# Altium footprint library IC_SMD_QUAD.PCBLIB: 124 footprints (part 5 of 8)
Each footprint in its own frame and in the unit in brackets; x right, y up, seen from the top. Pads: shape width x height; smd on the part's side, far side on the other; paste and mask are expansions set on the pad; w line width, h text height; cw(c..) or ccw(c..) is an arc to the next point about the centre after c.
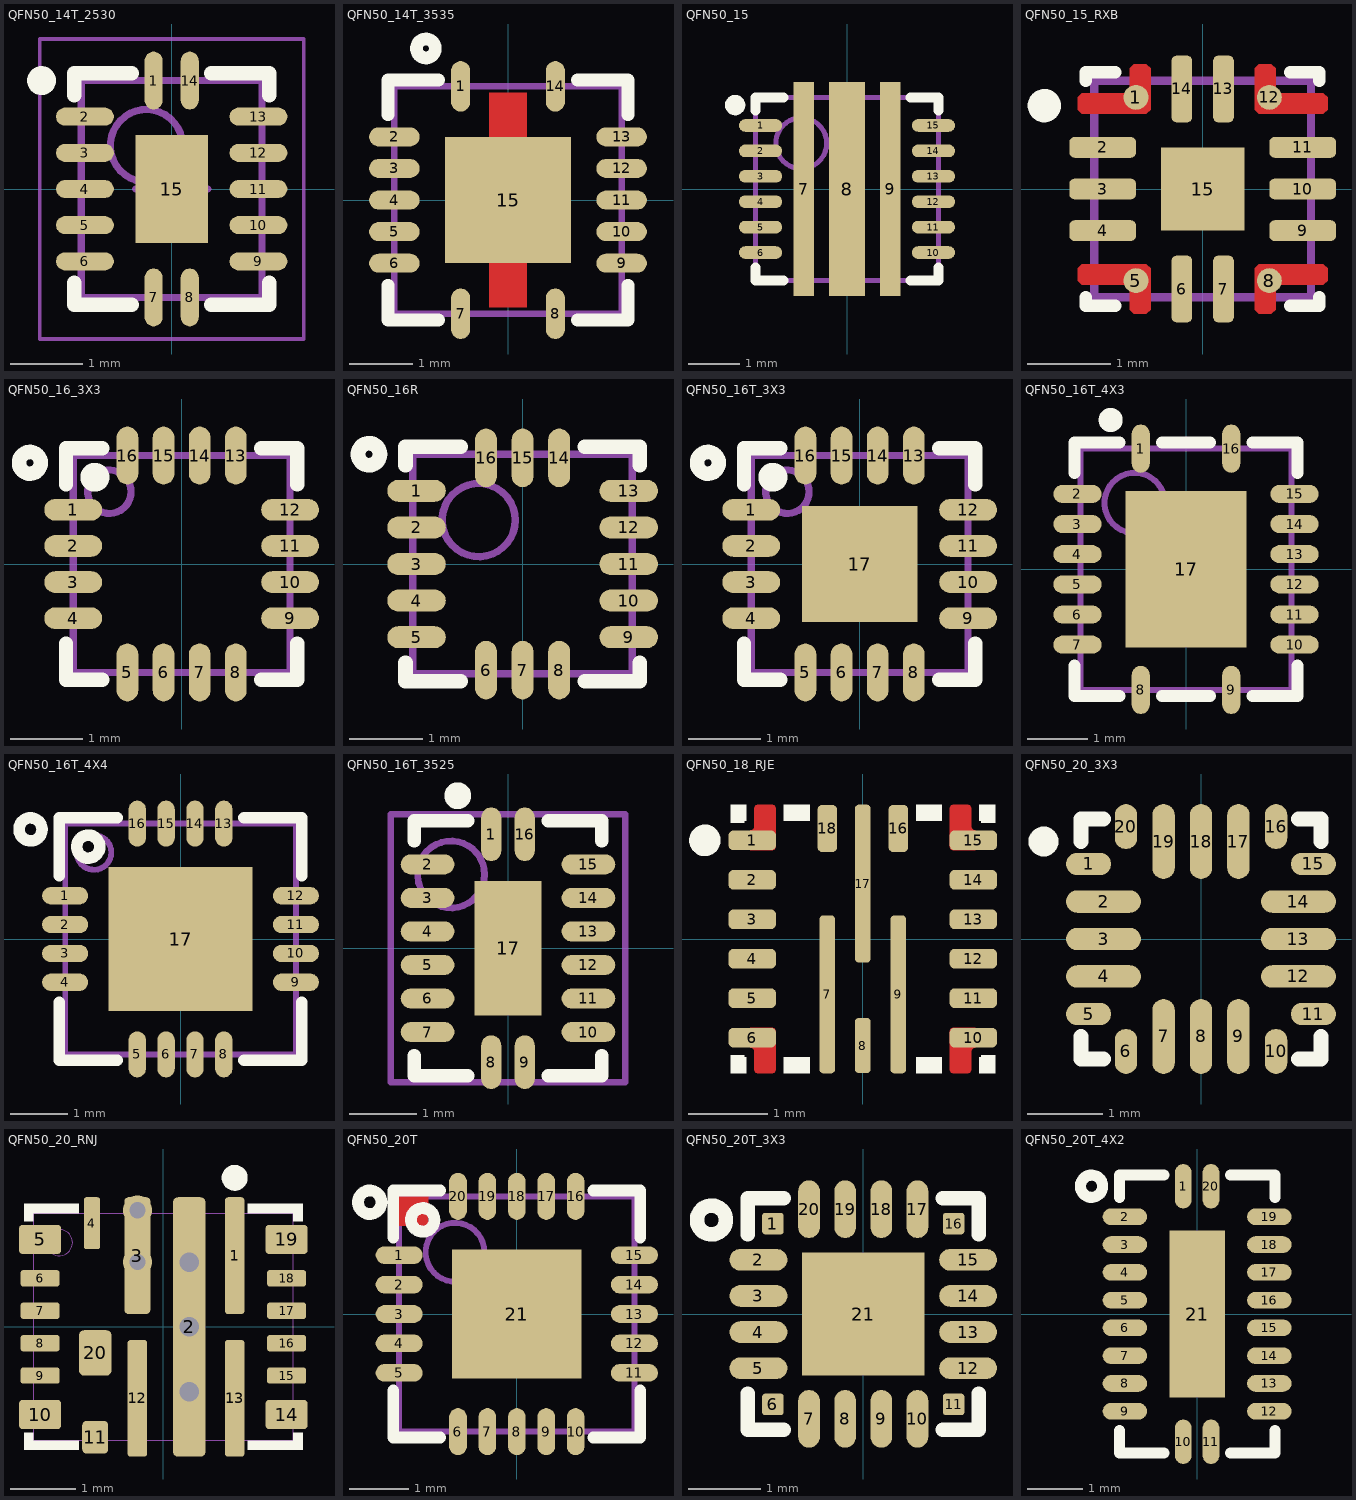
[diagram p4: the footprints below, top view; thin cyan lines are the x and y axes]

## QFN50_14T_2530 [mm] "DHVQFN14, 0.5mm pitch, 2.5x3x0.85mm"
height 1
pads (15):
  oval 0.25x0.8 smd mask+0.075: 1(-0.25,1.5) 7(-0.25,-1.5) 8(0.25,-1.5) 14(0.25,1.5)
  oval 0.8x0.25 smd mask+0.075: 2(-1.2,1) 3(-1.2,0.5) 4(-1.2,0) 5(-1.2,-0.5) 6(-1.2,-1) 9(1.2,-1) 10(1.2,-0.5) 11(1.2,0) 12(1.2,0.5) 13(1.2,1)
  rect 1x1.5 smd paste-3: 15(0,0)
TopOverlay:
  circle w0.2: c-1.8,1.5 r0.1
  lines w0.2: -1.35,-1.3 -1.35,-1.6 -0.55,-1.6 ; -1.35,1.3 -1.35,1.6 -0.55,1.6 ; 0.55,-1.6 1.35,-1.6 1.35,-1.3 ; 0.55,1.6 1.35,1.6 1.35,1.3
TopPaste:
  region: 0.4,-0.4 0.4,0.4 -0.4,0.4 -0.4,-0.4
Mechanical13:
  circle w0.1: c-0.35,0.6 r0.5
  lines w0.1: -1.25,-1.5 -1.25,1.5 1.25,1.5 1.25,-1.5 -1.25,-1.5
Mechanical15:
  lines w0.05: -1.825,-2.075 -1.825,2.075 1.825,2.075 1.825,-2.075 -1.825,-2.075
  lines w0.1: -0.5,0 0.5,0 ; 0,-0.5 0,0.5
3D body "QFN50_14T_2531.step": height 1, standoff 0, extent -1.251,-1.501 1.251,1.501

## QFN50_14T_3535 [mm] "S-PVQFN-N14, 3.5X3.5mm, pitch: 0.5mm, 6+2+6+2"
pads (15):
  oval 0.3x0.8 smd mask+0.075: 1(-0.75,1.8) 7(-0.75,-1.8) 8(0.75,-1.8) 14(0.75,1.8)
  oval 0.8x0.3 smd mask+0.075: 2(-1.8,1) 3(-1.8,0.5) 4(-1.8,0) 5(-1.8,-0.5) 6(-1.8,-1) 9(1.8,-1) 10(1.8,-0.5) 11(1.8,0) 12(1.8,0.5) 13(1.8,1)
  rect 2x2 smd paste-2 mask+0.1: 15(0,0)
TopLayer:
  rectangle: -0.3,-1.7 0.3,1.7
TopOverlay:
  circle w0.2: c-1.3,2.4 r0.15
  lines w0.2: -1.9,-1.35 -1.9,-1.9 -1.1,-1.9 ; -1.9,1.35 -1.9,1.9 -1.1,1.9 ; 1.1,-1.9 1.9,-1.9 1.9,-1.35 ; 1.1,1.9 1.9,1.9 1.9,1.35
TopPaste:
  rectangle: -0.9,0.1 -0.1,0.9
  region: 0.9,0.9 0.1,0.9 0.1,0.1 0.9,0.1
  region: 0.9,-0.1 0.1,-0.1 0.1,-0.9 0.9,-0.9
  rectangle: -0.9,-0.9 -0.1,-0.1
TopSolder:
  rectangle: -0.4,-1.8 0.4,1.8
Mechanical13:
  lines w0.1: -1.8,-1.8 1.8,-1.8 1.8,1.8 -1.8,1.8 -1.8,-1.8
3D body: height 1, standoff 0, extent -1.8,-1.8 1.8,1.8

## QFN50_15 [mm] "PVQFN-N15"
pads (15):
  oval 0.85x0.25 smd mask+0.075: 1(-1.7,1.25) 2(-1.7,0.75) 3(-1.7,0.25) 4(-1.7,-0.25) 5(-1.7,-0.75) 6(-1.7,-1.25) 10(1.7,-1.25) 11(1.7,-0.75) 12(1.7,-0.25) 13(1.7,0.25) 14(1.7,0.75) 15(1.7,1.25)
  rect 0.4x4.2 smd paste-1.8 mask+0.075: 7(-0.85,0) 9(0.85,0)
  rect 0.7x4.2 smd paste-1.8 mask+0.075: 8(0,0)
TopOverlay:
  circle w0.2: c-2.2,1.65 r0.1
  lines w0.2: -1.8,-1.55 -1.8,-1.8 -1.25,-1.8 ; -1.8,1.55 -1.8,1.8 -1.25,1.8 ; 1.25,-1.8 1.8,-1.8 1.8,-1.55 ; 1.25,1.8 1.8,1.8 1.8,1.55
TopPaste:
  rectangle: -1.05,1.3 -0.65,2.1
  rectangle: -1.05,-2.1 -0.65,-1.3
  rectangle: -1.05,0.2 -0.65,1
  rectangle: -1.05,-1 -0.65,-0.2
  region: 1.05,-0.2 0.65,-0.2 0.65,-1 1.05,-1
  region: 1.05,1 0.65,1 0.65,0.2 1.05,0.2
  region: 1.05,-1.3 0.65,-1.3 0.65,-2.1 1.05,-2.1
  region: 1.05,2.1 0.65,2.1 0.65,1.3 1.05,1.3
  rectangle: -0.3,-1 0.3,-0.2
  rectangle: -0.3,0.2 0.3,1
  rectangle: -0.3,-2.1 0.3,-1.3
  rectangle: -0.3,1.3 0.3,2.1
Mechanical13:
  circle w0.1: c-0.9,0.9 r0.5
  lines w0.1: -1.8,-1.8 -1.8,1.8 1.8,1.8 1.8,-1.8 -1.8,-1.8
3D body "QFN50_155.step": height 1.03, standoff 0.02, extent -1.801,-1.8 1.801,1.8

## QFN50_15_RXB [mm] "VQFN-FCRLF RXB, 2.6X2.6X1mm"
height 1
pads (15):
  round 0.3 smd paste-1 mask+0: 1(-0.8,1.1) 5(-0.8,-1.1) 8(0.8,-1.1) 12(0.8,1.1)
  rrect50% 0.8x0.25 smd paste+0 mask+0.05: 2(-1.2,0.5) 3(-1.2,0) 4(-1.2,-0.5) 9(1.2,-0.5) 10(1.2,0) 11(1.2,0.5)
  rrect50% 0.25x0.8 smd paste+0 mask+0.05: 6(-0.25,-1.2) 7(0.25,-1.2) 13(0.25,1.2) 14(-0.25,1.2)
  rect 1x1 smd paste-0.1 mask+0.05: 15(0,0)
TopLayer:
  region: 1.45,-0.9 1.5,-0.95 1.5,-1.1 1.45,-1.15 0.925,-1.15 0.875,-1.2 0.875,-1.45 0.825,-1.5 0.675,-1.5 0.625,-1.45 0.625,-0.95 0.675,-0.9
  region: -1.45,-0.9 -1.5,-0.95 -1.5,-1.1 -1.45,-1.15 -0.925,-1.15 -0.875,-1.2 -0.875,-1.45 -0.825,-1.5 -0.675,-1.5 -0.625,-1.45 -0.625,-0.95 -0.675,-0.9
  region: 1.45,0.9 1.5,0.95 1.5,1.1 1.45,1.15 0.925,1.15 0.875,1.2 0.875,1.45 0.825,1.5 0.675,1.5 0.625,1.45 0.625,0.95 0.675,0.9
  region: -1.45,0.9 -1.5,0.95 -1.5,1.1 -1.45,1.15 -0.925,1.15 -0.875,1.2 -0.875,1.45 -0.825,1.5 -0.675,1.5 -0.625,1.45 -0.625,0.95 -0.675,0.9
TopOverlay:
  circle w0.2: c-1.9,1 r0.1
  lines w0.15: -1.4,-1.3 -1.4,-1.4 -1.05,-1.4 ; -1.4,1.3 -1.4,1.4 -1.05,1.4 ; 1.05,-1.4 1.4,-1.4 1.4,-1.3 ; 1.05,1.4 1.4,1.4 1.4,1.3
TopSolder:
  region: 1.45,-0.9 1.5,-0.95 1.5,-1.1 1.45,-1.15 0.925,-1.15 0.875,-1.2 0.875,-1.45 0.825,-1.5 0.675,-1.5 0.625,-1.45 0.625,-0.95 0.675,-0.9
  region: -1.5,-1.1 -1.5,-0.95 -1.45,-0.9 -0.675,-0.9 -0.625,-0.95 -0.625,-1.45 -0.675,-1.5 -0.825,-1.5 -0.875,-1.45 -0.875,-1.2 -0.925,-1.15 -1.45,-1.15
  region: 1.5,1.1 1.5,0.95 1.45,0.9 0.675,0.9 0.625,0.95 0.625,1.45 0.675,1.5 0.825,1.5 0.875,1.45 0.875,1.2 0.925,1.15 1.45,1.15
  region: -1.45,0.9 -1.5,0.95 -1.5,1.1 -1.45,1.15 -0.925,1.15 -0.875,1.2 -0.875,1.45 -0.825,1.5 -0.675,1.5 -0.625,1.45 -0.625,0.95 -0.675,0.9
Mechanical13:
  lines w0.1: -1.3,-1.3 -1.3,1.3 1.3,1.3 1.3,-1.3 -1.3,-1.3

## QFN50_16_3X3 [mm] "LPCC, RGT, 16-lead, pitch: 0.5mm, 3x3mm"
height 1
pads (16):
  oval 0.8x0.3 smd mask+0.075: 1(-1.5,0.75) 2(-1.5,0.25) 3(-1.5,-0.25) 4(-1.5,-0.75) 9(1.5,-0.75) 10(1.5,-0.25) 11(1.5,0.25) 12(1.5,0.75)
  oval 0.3x0.8 smd mask+0.075: 5(-0.75,-1.5) 6(-0.25,-1.5) 7(0.25,-1.5) 8(0.75,-1.5) 13(0.75,1.5) 14(0.25,1.5) 15(-0.25,1.5) 16(-0.75,1.5)
TopOverlay:
  circle w0.2: c-2.1,1.4 r0.15
  circle w0.2: c-1.2,1.2 r0.1
  lines w0.2: -1.6,-1.1 -1.6,-1.6 -1.1,-1.6 ; -1.6,1.1 -1.6,1.6 -1.1,1.6 ; 1.1,-1.6 1.6,-1.6 1.6,-1.1 ; 1.1,1.6 1.6,1.6 1.6,1.1
Mechanical13:
  circle w0.1: c-1,1 r0.3
  lines w0.1: -1.5,-1.5 -1.5,1.5 1.5,1.5 1.5,-1.5 -1.5,-1.5
3D body: height 1, standoff 0, extent -1.5,-1.5 1.5,1.5

## QFN50_16R [mm] "TFLGA 3x3x1, 5+3+5+3, 3X3mm, 0.5mm pitch"
height 1
pads (16):
  oval 0.8x0.3 smd mask+0.075: 1(-1.45,1) 2(-1.45,0.5) 3(-1.45,0) 4(-1.45,-0.5) 5(-1.45,-1) 9(1.45,-1) 10(1.45,-0.5) 11(1.45,0) 12(1.45,0.5) 13(1.45,1)
  oval 0.3x0.8 smd mask+0.075: 6(-0.5,-1.45) 7(0,-1.45) 8(0.5,-1.45) 14(0.5,1.45) 15(0,1.45) 16(-0.5,1.45)
TopOverlay:
  circle w0.2: c-2.1,1.5 r0.15
  lines w0.2: -1.6,-1.35 -1.6,-1.6 -0.85,-1.6 ; -1.6,1.35 -1.6,1.6 -0.85,1.6 ; 0.85,-1.6 1.6,-1.6 1.6,-1.35 ; 0.85,1.6 1.6,1.6 1.6,1.35
Mechanical13:
  circle w0.1: c-0.6,0.6 r0.5
  lines w0.1: -1.5,-1.5 1.5,-1.5 1.5,1.5 -1.5,1.5 -1.5,-1.5
3D body: height 1, standoff 0, extent -1.5,-1.5 1.5,1.5

## QFN50_16T_3X3 [mm] "RGT PVQFN (TI), 16-lead, pitch: 0.5mm, 3x3mm"
height 1
pads (17):
  oval 0.8x0.3 smd mask+0.075: 1(-1.5,0.75) 2(-1.5,0.25) 3(-1.5,-0.25) 4(-1.5,-0.75) 9(1.5,-0.75) 10(1.5,-0.25) 11(1.5,0.25) 12(1.5,0.75)
  oval 0.3x0.8 smd mask+0.075: 5(-0.75,-1.5) 6(-0.25,-1.5) 7(0.25,-1.5) 8(0.75,-1.5) 13(0.75,1.5) 14(0.25,1.5) 15(-0.25,1.5) 16(-0.75,1.5)
  rect 1.6x1.6 smd paste-3 mask+0.1: 17(0,0)
TopOverlay:
  circle w0.2: c-2.1,1.4 r0.15
  circle w0.2: c-1.2,1.2 r0.1
  lines w0.2: -1.6,-1.1 -1.6,-1.6 -1.1,-1.6 ; -1.6,1.1 -1.6,1.6 -1.1,1.6 ; 1.1,-1.6 1.6,-1.6 1.6,-1.1 ; 1.1,1.6 1.6,1.6 1.6,1.1
TopPaste:
  rectangle: -0.7,-0.7 -0.1,-0.1
  region: 0.7,-0.1 0.1,-0.1 0.1,-0.7 0.7,-0.7
  region: 0.7,0.7 0.1,0.7 0.1,0.1 0.7,0.1
  rectangle: -0.7,0.1 -0.1,0.7
Mechanical13:
  circle w0.1: c-1,1 r0.3
  lines w0.1: -1.5,-1.5 -1.5,1.5 1.5,1.5 1.5,-1.5 -1.5,-1.5
3D body "RGT0016C.stp": height 1, standoff 0, extent -1.5,-1.5 1.5,1.5

## QFN50_16T_4X3 [mm] "VQFN-16 RGY 4X3.5mm, 0.5mm pitch"
height 1
pads (17):
  oval 0.3x0.8 smd mask+0.05: 1(-0.75,2) 8(-0.75,-2) 9(0.75,-2) 16(0.75,2)
  oval 0.8x0.3 smd mask+0.05: 2(-1.8,1.25) 3(-1.8,0.75) 4(-1.8,0.25) 5(-1.8,-0.25) 6(-1.8,-0.75) 7(-1.8,-1.25) 10(1.8,-1.25) 11(1.8,-0.75) 12(1.8,-0.25) 13(1.8,0.25) 14(1.8,0.75) 15(1.8,1.25)
  rect 2x2.6 smd paste-3: 17(0,0)
TopOverlay:
  circle w0.2: c-1.25,2.475 r0.1
  lines w0.2: -1.85,-1.6 -1.85,-2.1 -1.1,-2.1 ; -1.85,1.6 -1.85,2.1 -1.1,2.1 ; -0.4,-2.1 0.4,-2.1 ; -0.4,2.1 0.4,2.1 ; 1.1,-2.1 1.85,-2.1 1.85,-1.6 ; 1.1,2.1 1.85,2.1 1.85,1.6
TopPaste:
  rectangle: -0.9,0.2 -0.2,1.2
  region: 0.9,1.2 0.2,1.2 0.2,0.2 0.9,0.2
  region: 0.9,-0.2 0.2,-0.2 0.2,-1.2 0.9,-1.2
  rectangle: -0.9,-1.2 -0.2,-0.2
Mechanical13:
  circle w0.1: c-0.85,1.1 r0.5
  lines w0.1: -1.75,-2 1.75,-2 1.75,2 -1.75,2 -1.75,-2
3D body "QFN50_16T_400X350.step": height 1, standoff 0, extent -1.751,-2.001 1.751,2.001

## QFN50_16T_4X4 [mm] "QFN, 16, 4X4mm, 0.5mm"
height 1
pads (17):
  oval 0.8x0.3 smd mask+0.075: 1(-2,0.75) 2(-2,0.25) 3(-2,-0.25) 4(-2,-0.75) 9(2,-0.75) 10(2,-0.25) 11(2,0.25) 12(2,0.75)
  oval 0.3x0.8 smd mask+0.075: 5(-0.75,-2) 6(-0.25,-2) 7(0.25,-2) 8(0.75,-2) 13(0.75,2) 14(0.25,2) 15(-0.25,2) 16(-0.75,2)
  rect 2.5x2.5 smd paste-3 mask+0.1: 17(0,0)
TopOverlay:
  circle w0.2: c-1.6,1.6 r0.2
  circle w0.2: c-2.6,1.9 r0.2
  lines w0.2: -2.1,-1.1 -2.1,-2.1 -1.1,-2.1 ; -2.1,1.1 -2.1,2.1 -1.1,2.1 ; 1.1,-2.1 2.1,-2.1 2.1,-1.1 ; 1.1,2.1 2.1,2.1 2.1,1.1
TopPaste:
  rectangle: -1.1,-1.1 -0.2,-0.2
  region: 1.1,-0.2 0.2,-0.2 0.2,-1.1 1.1,-1.1
  region: 1.1,1.1 0.2,1.1 0.2,0.2 1.1,0.2
  rectangle: -1.1,0.2 -0.2,1.1
Mechanical13:
  circle w0.1: c-1.5,1.5 r0.3
  lines w0.1: -2,-2 -2,2 2,2 2,-2 -2,-2
3D body: height 1, standoff 0, extent -2,-2 2,2

## QFN50_16T_3525 [mm] "VQFN-16 RGY 3.5X2.5mm, 0.5mm pitch"
height 1
pads (17):
  oval 0.3x0.8 smd mask+0.05: 1(-0.25,1.7) 8(-0.25,-1.7) 9(0.25,-1.7) 16(0.25,1.7)
  oval 0.8x0.3 smd mask+0.05: 2(-1.2,1.25) 3(-1.2,0.75) 4(-1.2,0.25) 5(-1.2,-0.25) 6(-1.2,-0.75) 7(-1.2,-1.25) 10(1.2,-1.25) 11(1.2,-0.75) 12(1.2,-0.25) 13(1.2,0.25) 14(1.2,0.75) 15(1.2,1.25)
  rect 1x2 smd paste-0.1: 17(0,0)
TopOverlay:
  circle w0.2: c-0.75,2.275 r0.1
  lines w0.2: -1.4,-1.6 -1.4,-1.9 -0.6,-1.9 ; -1.4,1.6 -1.4,1.9 -0.6,1.9 ; 0.6,-1.9 1.4,-1.9 1.4,-1.6 ; 0.6,1.9 1.4,1.9 1.4,1.6
Mechanical13:
  circle w0.1: c-0.85,1.1 r0.5
  lines w0.1: -1.75,-2 -1.75,2 1.75,2 1.75,-2 -1.75,-2
3D body "User Library-User Library-DHVQFN 16.step": height 1, standoff -0.05, extent -1.31,-1.81 1.31,1.81

## QFN50_18_RJE [mm] "VQFN RJE, 18-Leads, Body 3x3mm, Pitch 0.50mm"
height 1
pads (18):
  rrect50% 0.6x0.25 smd paste-0.025 mask+0.05: 1(-1.4,1.25) 2(-1.4,0.75) 3(-1.4,0.25) 4(-1.4,-0.25) 5(-1.4,-0.75) 6(-1.4,-1.25) 10(1.4,-1.25) 11(1.4,-0.75) 12(1.4,-0.25) 13(1.4,0.25) 14(1.4,0.75) 15(1.4,1.25)
  rrect50% 0.2x2 smd mask+0.05: 7(-0.45,-0.701) 9(0.45,-0.701) 17(0,0.701)
  rrect50% 0.2x0.7 smd mask+0.05: 8(0,-1.349)
  rrect50% 0.25x0.6 smd paste-0.025 mask+0.05: 16(0.45,1.4) 18(-0.45,1.4)
TopLayer:
  region: 1.425,-1.125 1.15,-1.125 1.14,-1.125 1.122,-1.133 1.108,-1.147 1.1,-1.165 1.1,-1.175 1.1,-1.65 1.1,-1.66 1.108,-1.678 1.122,-1.692 1.14,-1.7 1.15,-1.7 1.325,-1.7 1.335,-1.7 1.353,-1.692 1.367,-1.678 1.375,-1.66 1.375,-1.65 1.375,-1.425 1.376,-1.415 1.383,-1.397 1.397,-1.383 1.415,-1.376 1.425,-1.375
  region: -1.425,-1.125 -1.15,-1.125 -1.14,-1.125 -1.122,-1.133 -1.108,-1.147 -1.1,-1.165 -1.1,-1.175 -1.1,-1.65 -1.1,-1.66 -1.108,-1.678 -1.122,-1.692 -1.14,-1.7 -1.15,-1.7 -1.325,-1.7 -1.335,-1.7 -1.353,-1.692 -1.367,-1.678 -1.375,-1.66 -1.375,-1.65 -1.375,-1.425 -1.376,-1.415 -1.383,-1.397 -1.397,-1.383 -1.415,-1.376 -1.425,-1.375
  region: 1.425,1.125 1.15,1.125 1.14,1.125 1.122,1.133 1.108,1.147 1.1,1.165 1.1,1.175 1.1,1.65 1.1,1.66 1.108,1.678 1.122,1.692 1.14,1.7 1.15,1.7 1.325,1.7 1.335,1.7 1.353,1.692 1.367,1.678 1.375,1.66 1.375,1.65 1.375,1.425 1.376,1.415 1.383,1.397 1.397,1.383 1.415,1.376 1.425,1.375
  region: -1.425,1.125 -1.15,1.125 -1.14,1.125 -1.122,1.133 -1.108,1.147 -1.1,1.165 -1.1,1.175 -1.1,1.65 -1.1,1.66 -1.108,1.678 -1.122,1.692 -1.14,1.7 -1.15,1.7 -1.325,1.7 -1.335,1.7 -1.353,1.692 -1.367,1.678 -1.375,1.66 -1.375,1.65 -1.375,1.425 -1.376,1.415 -1.383,1.397 -1.397,1.383 -1.415,1.376 -1.425,1.375
TopOverlay:
  circle w0.2: c-2,1.25 r0.1
  region: 1,-1.7 0.675,-1.7 0.675,-1.5 1,-1.5
  region: -1,-1.7 -0.675,-1.7 -0.675,-1.5 -1,-1.5
  region: 1,1.7 0.675,1.7 0.675,1.5 1,1.5
  region: -1,1.7 -0.675,1.7 -0.675,1.5 -1,1.5
  region: 1.475,-1.5 1.475,-1.7 1.675,-1.7 1.675,-1.475 1.5,-1.475 1.5,-1.5
  region: -1.475,-1.5 -1.475,-1.7 -1.675,-1.7 -1.675,-1.475 -1.5,-1.475 -1.5,-1.5
  region: 1.475,1.5 1.475,1.7 1.675,1.7 1.675,1.475 1.5,1.475 1.5,1.5
  region: -1.475,1.5 -1.475,1.7 -1.675,1.7 -1.675,1.475 -1.5,1.475 -1.5,1.5
TopPaste:
  region: 1.125,-1.25 1.125,-1.625 1.125,-1.635 1.133,-1.653 1.147,-1.667 1.165,-1.675 1.175,-1.675 1.3,-1.675 1.31,-1.675 1.328,-1.667 1.342,-1.653 1.35,-1.635 1.35,-1.625 1.35,-1.375 1.35,-1.37 1.354,-1.361 1.361,-1.354 1.37,-1.35 1.375,-1.35 1.375,-1.25
  region: -1.125,-1.25 -1.125,-1.625 -1.125,-1.635 -1.133,-1.653 -1.147,-1.667 -1.165,-1.675 -1.175,-1.675 -1.3,-1.675 -1.31,-1.675 -1.328,-1.667 -1.342,-1.653 -1.35,-1.635 -1.35,-1.625 -1.35,-1.375 -1.35,-1.37 -1.354,-1.361 -1.361,-1.354 -1.37,-1.35 -1.375,-1.35 -1.375,-1.25
  region: 1.125,1.25 1.125,1.625 1.125,1.635 1.133,1.653 1.147,1.667 1.165,1.675 1.175,1.675 1.3,1.675 1.31,1.675 1.328,1.667 1.342,1.653 1.35,1.635 1.35,1.625 1.35,1.375 1.35,1.37 1.354,1.361 1.361,1.354 1.37,1.35 1.375,1.35 1.375,1.25
  region: -1.125,1.25 -1.125,1.625 -1.125,1.635 -1.133,1.653 -1.147,1.667 -1.165,1.675 -1.175,1.675 -1.3,1.675 -1.31,1.675 -1.328,1.667 -1.342,1.653 -1.35,1.635 -1.35,1.625 -1.35,1.375 -1.35,1.37 -1.354,1.361 -1.361,1.354 -1.37,1.35 -1.375,1.35 -1.375,1.25
TopSolder:
  region: 1.175,-1.075 1.15,-1.075 1.104,-1.094 1.069,-1.129 1.05,-1.175 1.05,-1.2 1.05,-1.65 1.05,-1.67 1.065,-1.707 1.093,-1.735 1.13,-1.75 1.15,-1.75 1.325,-1.75 1.345,-1.75 1.382,-1.735 1.41,-1.707 1.425,-1.67 1.425,-1.65 1.425,-1.5 1.426,-1.485 1.438,-1.458 1.458,-1.438 1.485,-1.426 1.5,-1.425 1.5,-1.075
  region: -1.175,-1.075 -1.15,-1.075 -1.104,-1.094 -1.069,-1.129 -1.05,-1.175 -1.05,-1.2 -1.05,-1.65 -1.05,-1.67 -1.065,-1.707 -1.093,-1.735 -1.13,-1.75 -1.15,-1.75 -1.325,-1.75 -1.345,-1.75 -1.382,-1.735 -1.41,-1.707 -1.425,-1.67 -1.425,-1.65 -1.425,-1.5 -1.426,-1.485 -1.438,-1.458 -1.458,-1.438 -1.485,-1.426 -1.5,-1.425 -1.5,-1.075
  region: 1.175,1.075 1.15,1.075 1.104,1.094 1.069,1.129 1.05,1.175 1.05,1.2 1.05,1.65 1.05,1.67 1.065,1.707 1.093,1.735 1.13,1.75 1.15,1.75 1.325,1.75 1.345,1.75 1.382,1.735 1.41,1.707 1.425,1.67 1.425,1.65 1.425,1.5 1.426,1.485 1.438,1.458 1.458,1.438 1.485,1.426 1.5,1.425 1.5,1.075
  region: -1.175,1.075 -1.15,1.075 -1.104,1.094 -1.069,1.129 -1.05,1.175 -1.05,1.2 -1.05,1.65 -1.05,1.67 -1.065,1.707 -1.093,1.735 -1.13,1.75 -1.15,1.75 -1.325,1.75 -1.345,1.75 -1.382,1.735 -1.41,1.707 -1.425,1.67 -1.425,1.65 -1.425,1.5 -1.426,1.485 -1.438,1.458 -1.458,1.438 -1.485,1.426 -1.5,1.425 -1.5,1.075
3D body "RJE0018B.stp": height 1, standoff 0, extent -1.5,-1.5 1.5,1.5

## QFN50_20_3X3 [mm] "UFQFPN20, pitch: 0.5mm, 3x3mm"
height 0.6
pads (20):
  oval 0.6x0.3 smd paste+0 mask+0: 1(-1.499,1) 5(-1.499,-1) 11(1.499,-1) 15(1.499,1)
  oval 1x0.3 smd paste+0 mask+0: 2(-1.3,0.5) 3(-1.3,0) 4(-1.3,-0.5) 12(1.3,-0.5) 13(1.3,0) 14(1.3,0.5)
  oval 0.3x0.6 smd paste+0 mask+0: 6(-1,-1.499) 10(1,-1.499) 16(1,1.499) 20(-1,1.499)
  oval 0.3x1 smd paste+0 mask+0: 7(-0.5,-1.3) 8(0,-1.3) 9(0.5,-1.3) 17(0.5,1.3) 18(0,1.3) 19(-0.5,1.3)
TopOverlay:
  circle w0.2: c-2.1,1.3 r0.1
  lines w0.2: -1.6,-1.3 -1.6,-1.6 -1.3,-1.6 ; -1.6,1.3 -1.6,1.6 -1.3,1.6 ; 1.3,-1.6 1.6,-1.6 1.6,-1.3 ; 1.3,1.6 1.6,1.6 1.6,1.3
3D body "UFQFPN20_3x3x0p6-M.step": height 0.61, standoff 0, extent -1.499,-1.499 1.499,1.499

## QFN50_20_RNJ [mm] "VQFN RNJ, 20-Leads, Body 3.5x4mm, Pitch 0.50mm"
height 4.4
pads (20):
  rrect30% 0.3x1.8 smd mask+0.05: 1(1.1,1.1) 12(-0.4,-1.1) 13(1.1,-1.1)
  rrect30% 0.5x4 smd mask+0.05: 2(0.4,0)
  rrect30% 0.4x1.8 smd mask+0.05: 3(-0.4,1.1)
  rrect30% 0.25x0.8 smd mask+0.05: 4(-1.1,1.6)
  rrect25% 0.65x0.45 smd mask+0.05: 5(-1.9,1.35) 10(-1.9,-1.35) 14(1.9,-1.35) 19(1.9,1.35)
  rrect30% 0.6x0.25 smd mask+0.05: 6(-1.9,0.75) 7(-1.9,0.25) 8(-1.9,-0.25) 9(-1.9,-0.75) 15(1.9,-0.75) 16(1.9,-0.25) 17(1.9,0.25) 18(1.9,0.75)
  rrect30% 0.4x0.5 smd mask+0.05: 11(-1.05,-1.7)
  rrect30% 0.5x0.7 smd mask+0.05: 20(-1.05,-0.4)
via -0.4,1.8 diameter 0.45 hole 0.25
via -0.4,1 diameter 0.45 hole 0.25
via 0.4,1 diameter 0.5 hole 0.3
via 0.4,0 diameter 0.5 hole 0.3
via 0.4,-1 diameter 0.5 hole 0.3
TopOverlay:
  circle w0.2: c1.1,2.3 r0.1
  rectangle: 1.3,1.75 2.15,1.9
  rectangle: 2,1.625 2.15,1.9
  region: -2,1.9 -2.15,1.9 -2.15,1.625 -2,1.625
  region: -1.3,1.9 -2.15,1.9 -2.15,1.75 -1.3,1.75
  region: -2,-1.625 -2.15,-1.625 -2.15,-1.9 -2,-1.9
  region: -1.3,-1.75 -2.15,-1.75 -2.15,-1.9 -1.3,-1.9
  rectangle: 2,-1.9 2.15,-1.625
  rectangle: 1.3,-1.9 2.15,-1.75
Mechanical13:
  circle w0.01: c-1.6,1.3 r0.2
  lines w0.01: -2,-1.75 2,-1.75 2,1.75 -2,1.75 -2,-1.75
3D body "RNJ0020A.stp": height 1, standoff 0, extent -2,-1.75 2,1.75

## QFN50_20T [mm] "QFN, 20, 4X4mm, 0.5mm"
height 1
pads (21):
  oval 0.8x0.3 smd mask+0.05: 1(-2,1) 2(-2,0.5) 3(-2,0) 4(-2,-0.5) 5(-2,-1) 11(2,-1) 12(2,-0.5) 13(2,0) 14(2,0.5) 15(2,1)
  oval 0.3x0.8 smd mask+0.05: 6(-1,-2) 7(-0.5,-2) 8(0,-2) 9(0.5,-2) 10(1,-2) 16(1,2) 17(0.5,2) 18(0,2) 19(-0.5,2) 20(-1,2)
  rect 2.2x2.2 smd paste-2 mask+0.1: 21(0,0)
TopLayer:
  rectangle: -2,1.5 -1.5,2
TopOverlay:
  circle w0.2: c-2.5,1.9 r0.2
  circle w0.2: c-1.6,1.6 r0.2
  lines w0.2: -2.1,-1.3 -2.1,-2.1 -1.3,-2.1 ; -2.1,1.3 -2.1,2.1 -1.3,2.1 ; 1.3,-2.1 2.1,-2.1 2.1,-1.3 ; 1.3,2.1 2.1,2.1 2.1,1.3
TopPaste:
  rectangle: -1,0.2 -0.2,1
  region: 1,1 0.2,1 0.2,0.2 1,0.2
  region: 1,-0.2 0.2,-0.2 0.2,-1 1,-1
  rectangle: -1,-1 -0.2,-0.2
Mechanical13:
  circle w0.1: c-1.05,1.05 r0.5
  lines w0.1: -2,-2 2,-2 2,2 -2,2 -2,-2
3D body: height 1, standoff 0, extent -2,-2 2,2

## QFN50_20T_3X3 [mm] "QFN20, pitch: 0.5mm, 3x3mm"
height 0.6
pads (21):
  rrect30% 0.3x0.3 smd mask+0.05: 1(-1.25,1.25) 6(-1.25,-1.25) 11(1.25,-1.25) 16(1.25,1.25)
  oval 0.8x0.3 smd mask+0.05: 2(-1.45,0.75) 3(-1.45,0.25) 4(-1.45,-0.25) 5(-1.45,-0.75) 12(1.45,-0.75) 13(1.45,-0.25) 14(1.45,0.25) 15(1.45,0.75)
  oval 0.3x0.8 smd mask+0.05: 7(-0.75,-1.45) 8(-0.25,-1.45) 9(0.25,-1.45) 10(0.75,-1.45) 17(0.75,1.45) 18(0.25,1.45) 19(-0.25,1.45) 20(-0.75,1.45)
  rect 1.7x1.7 smd paste-3 mask+0.05: 21(0,0)
TopOverlay:
  circle w0.2: c-2.1,1.3 r0.2
  lines w0.2: -1.6,-1.1 -1.6,-1.6 -1.1,-1.6 ; -1.6,1.1 -1.6,1.6 -1.1,1.6 ; 1.1,-1.6 1.6,-1.6 1.6,-1.1 ; 1.1,1.6 1.6,1.6 1.6,1.1
TopPaste:
  rectangle: -0.5,-0.5 0.5,0.5
3D body "SW3dPS-QFN-20.STEP": height 0.62, standoff -0.08, extent -1.5,-1.5 1.5,1.5

## QFN50_20T_4X2 [mm] "RGY VQFN-20, 0.5mm Pitch, 4.5x2.5x1mm"
height 1
pads (21):
  oval 0.3x0.8 smd mask+0.075: 1(-0.25,2.3) 10(-0.25,-2.3) 11(0.25,-2.3) 20(0.25,2.3)
  oval 0.8x0.3 smd mask+0.075: 2(-1.3,1.75) 3(-1.3,1.25) 4(-1.3,0.75) 5(-1.3,0.25) 6(-1.3,-0.25) 7(-1.3,-0.75) 8(-1.3,-1.25) 9(-1.3,-1.75) 12(1.3,-1.75) 13(1.3,-1.25) 14(1.3,-0.75) 15(1.3,-0.25) 16(1.3,0.25) 17(1.3,0.75) 18(1.3,1.25) 19(1.3,1.75)
  rect 1x3 smd paste-3 mask+0.1: 21(0,0)
TopOverlay:
  circle w0.2: c-1.9,2.3 r0.2
  lines w0.2: -1.4,-2.1 -1.4,-2.5 -0.6,-2.5 ; -1.4,2.1 -1.4,2.5 -0.6,2.5 ; 0.6,-2.5 1.4,-2.5 1.4,-2.1 ; 0.6,2.5 1.4,2.5 1.4,2.1
TopPaste:
  rectangle: -0.4,0.2 0.4,1.4
  rectangle: -0.4,-1.4 0.4,-0.2
3D body: height 1, standoff 0, extent -1.3,-2.4 1.3,2.4